# Altium footprint library Connector_art.PcbLib: 209 footprints (part 14 of 14)
Each footprint in its own frame and in the unit in brackets; x right, y up, seen from the top. Pads: shape width x height; smd on the part's side, far side on the other; paste and mask are expansions set on the pad; w line width, h text height; cw(c..) or ccw(c..) is an arc to the next point about the centre after c.
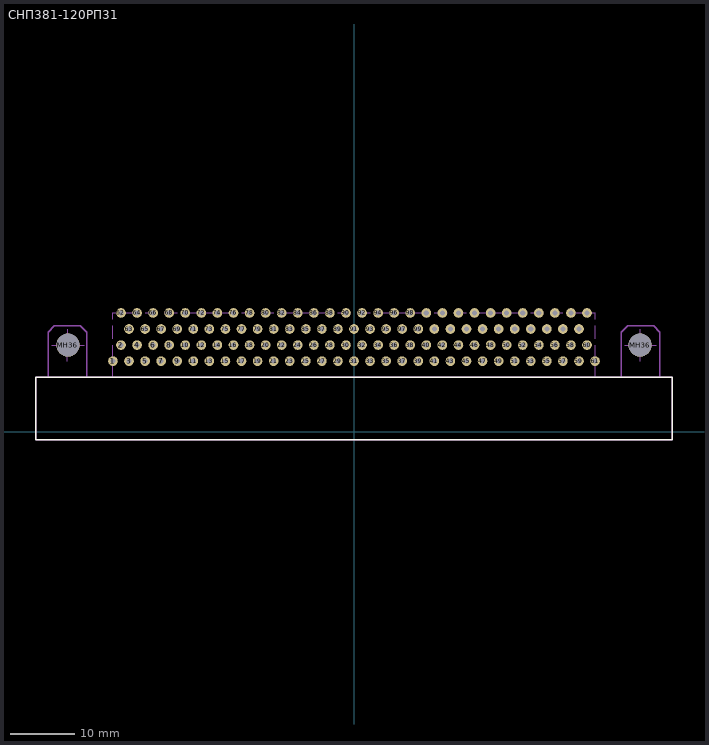
[diagram p13: the footprint, top view; thin cyan lines are the x and y axes]

## СНП381-120РП31 [mm]
height 7.3
pads (122):
  round 1.5 hole 0.8: 1(-37.5,11) 2(-36.25,13.5) 3(-35,11) 4(-33.75,13.5) 5(-32.5,11) 6(-31.25,13.5) 7(-30,11) 8(-28.75,13.5) 9(-27.5,11) 10(-26.25,13.5) 11(-25,11) 12(-23.75,13.5) 13(-22.5,11) 14(-21.25,13.5) 15(-20,11) 16(-18.75,13.5) 17(-17.5,11) 18(-16.25,13.5) 19(-15,11) 20(-13.75,13.5) 21(-12.5,11) 22(-11.25,13.5) 23(-10,11) 24(-8.75,13.5) 25(-7.5,11) 26(-6.25,13.5) 27(-5,11) 28(-3.75,13.5) 29(-2.5,11) 30(-1.25,13.5) 31(0,11) 32(1.25,13.5) 33(2.5,11) 34(3.75,13.5) 35(5,11) 36(6.25,13.5) 37(7.5,11) 38(8.75,13.5) 39(10,11) 40(11.25,13.5) 41(12.5,11) 42(13.75,13.5) 43(15,11) 44(16.25,13.5) 45(17.5,11) 46(18.75,13.5) 47(20,11) 48(21.25,13.5) 49(22.5,11) 50(23.75,13.5) 51(25,11) 52(26.25,13.5) 53(27.5,11) 54(28.75,13.5) 55(30,11) 56(31.25,13.5) 57(32.5,11) 58(33.75,13.5) 59(35,11) 60(36.25,13.5) 61(37.5,11) 62(-36.25,18.5) 63(-35,16) 64(-33.75,18.5) 65(-32.5,16) 66(-31.25,18.5) 67(-30,16) 68(-28.75,18.5) 69(-27.5,16) 70(-26.25,18.5) 71(-25,16) 72(-23.75,18.5) 73(-22.5,16) 74(-21.25,18.5) 75(-20,16) 76(-18.75,18.5) 77(-17.5,16) 78(-16.25,18.5) 79(-15,16) 80(-13.75,18.5) 81(-12.5,16) 82(-11.25,18.5) 83(-10,16) 84(-8.75,18.5) 85(-7.5,16) 86(-6.25,18.5) 87(-5,16) 88(-3.75,18.5) 89(-2.5,16) 90(-1.25,18.5) 91(0,16) 92(1.25,18.5) 93(2.5,16) 94(3.75,18.5) 95(5,16) 96(6.25,18.5) 97(7.5,16) 98(8.75,18.5) 99(10,16) 100(11.25,18.5) 101(12.5,16) 102(13.75,18.5) 103(15,16) 104(16.25,18.5) 105(17.5,16) 106(18.75,18.5) 107(20,16) 108(21.25,18.5) 109(22.5,16) 110(23.75,18.5) 111(25,16) 112(26.25,18.5) 113(27.5,16) 114(28.75,18.5) 115(30,16) 116(31.25,18.5) 117(32.5,16) 118(33.75,18.5) 119(35,16) 120(36.25,18.5)
  round 3.6 hole 3.6 unplated: MH36(-44.5,13.5) MH36(44.5,13.5)
Top Overlay:
  lines w0.25: -49.5,-1.25 -49.5,8.5 49.5,8.5 49.5,-1.25 -49.5,-1.25
Mechanical 1:
  lines w0.1: -47,13.5 -42,13.5 ; -44.6,11 -44.5,16 ; -37.5,8.5 -37.5,10.5 ; -37.5,11.5 -37.5,13.5 ; -37.5,14.5 -37.5,16.5 ; -37.5,17.5 -37.5,18.5 -36.5,18.5 ; -35.5,18.5 -33.5,18.5 ; -32.5,18.5 -30.5,18.5 ; -29.5,18.5 -27.5,18.5 ; -26.5,18.5 -24.5,18.5 ; -23.5,18.5 -21.5,18.5 ; -20.5,18.5 -18.5,18.5 ; -17.5,18.5 -15.5,18.5 ; -14.5,18.5 -12.5,18.5 ; -11.5,18.5 -9.5,18.5 ; -8.5,18.5 -6.5,18.5 ; -5.5,18.5 -3.5,18.5 ; -2.5,18.5 -0.5,18.5 ; 0.5,18.5 2.5,18.5 ; 3.5,18.5 5.5,18.5 ; 6.5,18.5 8.5,18.5 ; 9.5,18.5 11.5,18.5 ; 12.5,18.5 14.5,18.5 ; 15.5,18.5 17.5,18.5 ; 18.5,18.5 20.5,18.5 ; 21.5,18.5 23.5,18.5 ; 24.5,18.5 26.5,18.5 ; 27.5,18.5 29.5,18.5 ; 30.5,18.5 32.5,18.5 ; 33.5,18.5 35.5,18.5 ; 36.5,18.5 37.5,18.5 37.5,17.5 ; 37.5,8.5 37.5,10.5 ; 37.5,11.5 37.5,13.5 ; 37.5,14.5 37.5,16.5 ; 42.1,13.5 47,13.5 ; 44.5,11 44.5,16
  lines w0.2: -47.6,8.5 -47.6,15.5 -46.6,16.5 -42.6,16.5 -41.6,15.5 -41.6,8.5 ; 41.6,8.5 41.6,15.5 42.6,16.5 46.6,16.5 47.6,15.5 47.6,8.5 ; -49.5,-1.2 -49.5,8.5 49.5,8.5 49.5,-1.2 -49.5,-1.2
3D body: height 7.3, standoff -3, extent -49.5,-1.2 49.5,19.75